# Altium footprint library MyComponents_v2.5.PcbLib: 403 footprints (part 15 of 26)
Each footprint in its own frame and in the unit in brackets; x right, y up, seen from the top. Pads: shape width x height; smd on the part's side, far side on the other; paste and mask are expansions set on the pad; w line width, h text height; cw(c..) or ccw(c..) is an arc to the next point about the centre after c.
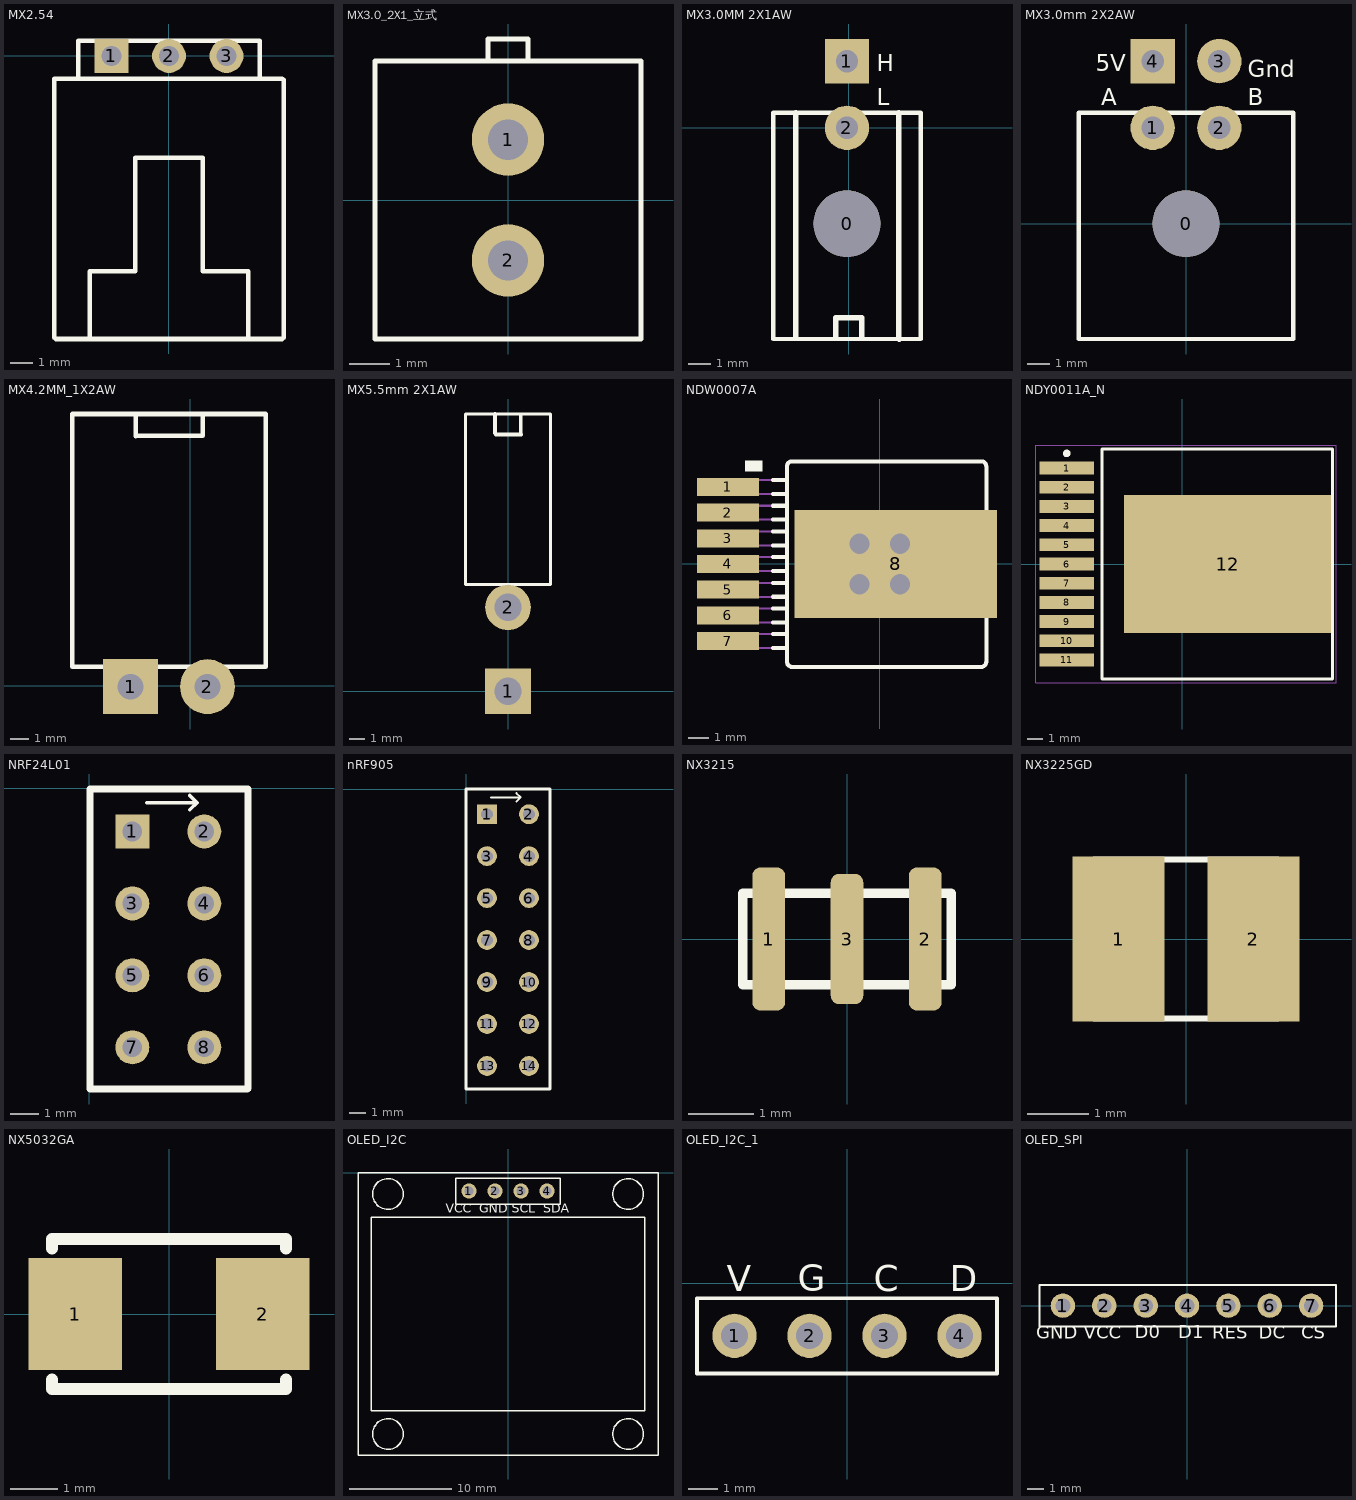
[diagram p14: the footprints below, top view; thin cyan lines are the x and y axes]

## MX2.54 [mm] "带锁插座"
pads (3):
  rect 1.5x1.5 hole 0.9: 1(-2.54,0)
  round 1.5 hole 0.9: 2(0,0) 3(2.54,0)
Top Overlay:
  lines w0.2: 5.06,-1.06 5.06,-6.44 5.06,-12.44 5,-12.5 -5,-12.5 -5.06,-12.44 -5.06,-1 ; -5.06,-1 -4,-1 -4,0.67 4,0.67 4,-1 5,-1 -5.06,-1 ; -3.5,-12.5 3.5,-12.5 3.5,-9.5 1.5,-9.5 1.5,-4.5 -1.5,-4.5 -1.5,-9.5 -3.5,-9.5 -3.5,-12.5

## MX3.0_2X1_立式 [mm]
pads (2):
  round 1.8 hole 1: 1(0,1.5) 2(0,-1.5)
Top Overlay:
  lines w0.127: -0.5,3.45 -0.5,4 0.5,4 0.5,3.45 ; -3.3,-3.45 3.3,-3.45 3.3,3.45 -3.3,3.45 -3.3,-3.45
3D body "MX3.0立式.STE": height 9.2, standoff -2.6, extent -3.302,-3.817 3.298,4.783

## MX3.0MM 2X1AW [mm]
pads (3):
  round 3 hole 3: 0(-0.074,-4.32)
  rect 2x2 hole 1: 1(-0.075,3)
  round 2 hole 1: 2(-0.075,0)
Top Overlay:
  lines w0.2: -3.4,-9.52 3.252,-9.52 3.252,0.68 -3.4,0.68 -3.4,-9.52
  lines w0.254: -2.386,-9.423 -2.386,0.68 ; -0.583,-9.423 -0.583,-8.56 0.585,-8.56 0.585,-9.474 ; 2.262,0.68 2.262,-9.495 2.287,-9.52
  text "L" at 1.27,1.016 h0.76
  text "H" at 1.27,2.54 h0.76
3D body "MX3.0mm 2x1.STEP": height 8.6, standoff -3.3, extent -3.376,-9.495 3.224,3.2

## MX3.0mm 2X2AW [mm] "molex 43025 3.0mm间距弯针(90°)"
pads (5):
  round 3 hole 3: 0(0,0)
  round 2 hole 1: 1(-1.5,4.32) 2(1.5,4.32) 3(1.5,7.32)
  rect 2x2 hole 1: 4(-1.5,7.32)
Top Overlay:
  lines w0.2: -4.825,-5.2 4.825,-5.2 4.825,5 -4.825,5 -4.825,-5.2
  text "B" at 2.794,5.334 h0.76
  text "A" at -3.81,5.334 h0.76
  text "Gnd" at 2.794,6.604 h0.76
  text "5V" at -4.064,6.858 h0.76
3D body "MX3.0 2X2.stp": height 12.23, standoff 1.47, extent -5.55,-7.3 4.6,8.1

## MX4.2MM_1X2AW [mm] "4.2mm间距"
pads (2):
  rect 3x3 hole 1.4: 1(-3.277,-0.051)
  round 3 hole 1.4: 2(0.94,-0.051)
Top Overlay:
  lines w0.254: -2.997,14.834 -2.997,13.665 -2.972,13.691 0.686,13.691 0.686,14.884 ; -6.477,1.041 4.14,1.041 4.14,14.884 -6.477,14.884 -6.477,2.769 -6.477,1.041

## MX5.5mm 2X1AW [mm] "molex 5569 5.5mm间距弯针(90°)"
pads (2):
  rect 3x3 hole 1.8: 1(0,0)
  round 3 hole 1.8: 2(0,5.5)
Top Overlay:
  lines w0.2: -2.8,7 -2.8,18.2 2.8,18.2 2.8,7 -2.8,7
  lines w0.254: -0.864,18.2 -0.864,16.942 -0.787,16.866 0.864,16.866 0.838,16.891 0.838,18.161
3D body "MX4.2.STEP": height 11.55, standoff -4.65, extent -2.743,-0.354 2.757,18.946

## NDW0007A [mm]
pads (8):
  rect 3.06x0.89 smd paste+0 mask+0.051: 1(-7.5,3.81) 2(-7.5,2.54) 3(-7.5,1.27) 4(-7.5,0) 5(-7.5,-1.27) 6(-7.5,-2.54) 7(-7.5,-3.81)
  rect 10x5.35 smd paste+0 mask+0.051: 8(0.8,0)
via 1,1 diameter 1.5 hole 1
via 1,-1 diameter 1.5 hole 1
via -1,-1 diameter 1.5 hole 1
via -1,1 diameter 1.5 hole 1
Top Overlay:
  region: -5.8,5.1 -6.65,5.1 -6.65,4.575 -5.8,4.575
  lines w0.2: -5.28,-4.16 -4.58,-4.16 -4.58,-3.47 -5.28,-3.47 ; -5.28,-2.89 -4.58,-2.89 -4.58,-2.2 -5.28,-2.2 ; -5.28,-1.62 -4.58,-1.62 -4.58,-0.93 -5.28,-0.93 ; -5.28,-0.35 -4.58,-0.35 -4.58,0.34 -5.28,0.34 ; -5.28,0.92 -4.58,0.92 -4.58,1.61 -5.28,1.61 ; -5.28,2.19 -4.58,2.19 -4.58,2.88 -5.28,2.88 ; -5.28,3.46 -4.58,3.46 -4.58,4.15 -5.28,4.15 ; -4.58,-4.837 ccw(c-4.33,-4.835) -4.332,-5.085 -4.33,-5.085 5.02,-5.085 5.022,-5.085 ccw(c5.02,-4.835) 5.27,-4.837 5.27,-4.835 5.27,4.825 5.27,4.827 ccw(c5.02,4.825) 5.022,5.075 5.02,5.075 -4.33,5.075 -4.332,5.075 ccw(c-4.33,4.825) -4.58,4.827 -4.58,4.825 -4.58,-4.835 -4.58,-4.837
Mechanical 13:
  lines w0.1: -4.332,-5.085 cw(c-4.33,-4.835) -4.58,-4.837 -4.58,-4.835 -4.58,4.825 -4.58,4.827 cw(c-4.33,4.825) -4.332,5.075 ; -4.33,-5.085 5.02,-5.085 ; -4.33,5.075 5.02,5.075 ; 5.022,-5.085 ccw(c5.02,-4.835) 5.27,-4.837 ; 5.022,5.075 cw(c5.02,4.825) 5.27,4.827 ; 5.27,-4.835 5.27,4.825 ; -8.5,-4.16 -8.5,-3.47 -5.28,-3.47 -4.58,-3.47 -4.58,-4.16 -5.28,-4.16 -8.5,-4.16 ; -8.5,-2.89 -8.5,-2.2 -5.28,-2.2 -4.58,-2.2 -4.58,-2.89 -5.28,-2.89 -8.5,-2.89 ; -8.5,-1.62 -8.5,-0.93 -5.28,-0.93 -4.58,-0.93 -4.58,-1.62 -5.28,-1.62 -8.5,-1.62 ; -8.5,-0.35 -8.5,0.34 -5.28,0.34 -4.58,0.34 -4.58,-0.35 -5.28,-0.35 -8.5,-0.35 ; -8.5,0.92 -8.5,1.61 -5.28,1.61 -4.58,1.61 -4.58,0.92 -5.28,0.92 -8.5,0.92 ; -8.5,2.19 -8.5,2.88 -5.28,2.88 -4.58,2.88 -4.58,2.19 -5.28,2.19 -8.5,2.19 ; -8.5,3.46 -8.5,4.15 -5.28,4.15 -4.58,4.15 -4.58,3.46 -5.28,3.46 -8.5,3.46
3D body "NDW0007A.stp": height 4.77, standoff 0, extent -8.601,-5.08 5.169,5.08

## NDY0011A_N [mm]
pads (12):
  rect 3.6x0.85 smd paste+0 mask+0.051: 1(-7.65,6.35) 2(-7.65,5.08) 3(-7.65,3.81) 4(-7.65,2.54) 5(-7.65,1.27) 6(-7.65,0) 7(-7.65,-1.27) 8(-7.65,-2.54) 9(-7.65,-3.81) 10(-7.65,-5.08) 11(-7.65,-6.35)
  rect 13.7x9.126 smd paste+0 mask+0.051: 12(3,0)
Top Overlay:
  circle w0.25: c-7.65,7.325 r0.125
  lines w0.2: -5.3,-7.625 -5.3,7.625 9.95,7.625 9.95,-7.625 -5.3,-7.625
Mechanical 13:
Mechanical 15:
  lines w0.05: -9.687,-7.875 10.188,-7.875 10.188,7.875 -9.687,7.875 -9.687,-7.875
  lines w0.1: -0.5,0 0.5,0 ; 0,-0.5 0,0.5
3D body "NDY0011A.stp": height 6.1, standoff -0.01, extent -8.756,-7.5 9.024,7.5

## NRF24L01 [mm] "2.4G"
pads (8):
  rect 1.2x1.2 hole 0.7: 1(1.524,-1.524)
  round 1.2 hole 0.7: 2(4.064,-1.524) 3(1.524,-4.064) 4(4.064,-4.064) 5(1.524,-6.604) 6(4.064,-6.604) 7(1.524,-9.144) 8(4.064,-9.144)
Top Overlay:
  lines w0.127: 2.032,-0.508 3.81,-0.508 ; 3.556,-0.254 3.81,-0.508 ; 3.81,-0.508 3.556,-0.762 3.81,-0.508
  lines w0.254: 0.024,-10.617 5.588,-10.617 5.613,-10.592 5.613,-0.024 0.024,-0.024 0.024,-10.617
Bottom Overlay:
  text "3V3" at 5.08,-0.762 h0.76
  text "GND" at 2.54,-0.762 h0.76

## nRF905 [mm] "433/868/915MHz"
pads (14):
  rect 1.2x1.2 hole 0.7: 1(1.27,-1.524)
  round 1.2 hole 0.7: 2(3.81,-1.524) 3(1.27,-4.064) 4(3.81,-4.064) 5(1.27,-6.604) 6(3.81,-6.604) 7(1.27,-9.144) 8(3.81,-9.144) 9(1.27,-11.684) 10(3.81,-11.684) 11(1.27,-14.224) 12(3.81,-14.224) 13(1.27,-16.764) 14(3.81,-16.764)
Top Overlay:
  lines w0.127: 1.524,-0.508 3.302,-0.508 ; 3.048,-0.762 3.302,-0.508 ; 3.048,-0.254 3.302,-0.508
  lines w0.2: 0,-18.161 0,0 5.08,0 5.08,-18.161 0,-18.161
Bottom Overlay:
  text "GND" at 3.556,-18.034 h0.76
  text "3V3" at 2.286,-0.762 h0.76

## NX3215 [mm]
pads (3):
  rrect50% 0.5x2.2 smd: 1(-1.2,0) 2(1.2,0)
  rrect50% 0.5x2 smd: 3(0,0)
Top Overlay:
  lines w0.15: -1.6,-0.7 1.6,-0.7 1.6,0.7 -1.6,0.7 -1.6,-0.7
3D body "NX3215SA.step": height 0.8, standoff 0, extent -1.6,-0.75 1.6,0.75

## NX3225GD [mm]
pads (2):
  rect 1.5x2.7 smd: 1(-1.1,0) 2(1.1,0)
Top Overlay:
  lines w0.1: -1.5,-1.3 1.5,-1.3 ; -1.5,1.3 1.5,1.3
3D body "SX3225.step": height 0.81, standoff 0, extent -1.625,-1.25 1.575,1.25

## NX5032GA [mm] "贴片晶振，5mm x 3.2mm"
pads (2):
  rect 2x2.4 smd: 1(-2,0) 2(2,0)
Top Overlay:
  lines w0.254: -2.5,-1.4 -2.5,-1.6 -2,-1.6 2,-1.6 2.5,-1.6 2.5,-1.4 ; -2.5,1.4 -2.5,1.6 -2,1.6 2,1.6 2.5,1.6 2.5,1.4
3D body "User Library-ABM3-1.STEP": height 1.3, standoff 0, extent -2.5,-1.6 2.5,1.6

## OLED_I2C [mm]
pads (4):
  round 1.5 hole 0.9: 1(-3.81,-1.778) 2(-1.27,-1.778) 3(1.27,-1.778) 4(3.81,-1.778)
Top Overlay:
  circle w0.127: c11.725,-25.51 r1.5
  circle w0.127: c-11.725,-25.51 r1.5
  circle w0.127: c11.725,-2.06 r1.5
  circle w0.127: c-11.725,-2.06 r1.5
  lines w0.127: -5.08,-3.052 5.08,-3.052 ; -5.08,-3.048 -5.08,-0.508 5.08,-0.508 5.08,-3.048 ; -14.65,-27.57 14.65,-27.57 14.65,0 -14.65,0 -14.65,-27.57 ; -13.335,-23.241 13.335,-23.241 13.335,-4.318 -13.335,-4.318 -13.335,-23.241
  text "SDA" at 3.429,-4.191 h1.52
  text "SCL" at 0.381,-4.191 h1.52
  text "GND" at -2.794,-4.191 h1.52
  text "VCC" at -6.096,-4.191 h1.52
3D body "Femal Header 1x4.step": height 8.5, standoff -3.2, extent -5.08,-3.15 5.08,-0.61
3D body "OLED 0.96inch.step": height 13.47, standoff 2.63, extent -13.39,-27.428 13.31,0.432

## OLED_I2C_1 [mm] "无外框"
pads (4):
  round 1.5 hole 0.9: 1(-3.81,-1.778) 2(-1.27,-1.778) 3(1.27,-1.778) 4(3.81,-1.778)
Top Overlay:
  lines w0.127: -5.08,-3.052 5.08,-3.052 ; -5.08,-3.048 -5.08,-0.508 5.08,-0.508 5.08,-3.048
  text "V" at -4.075,-0.575 h1.52
  text "G" at -1.675,-0.55 h1.52
  text "C" at 0.9,-0.575 h1.52
  text "D" at 3.475,-0.575 h1.52
3D body "Femal Header 1x4.step": height 8.5, standoff -3.2, extent -5.08,-3.15 5.08,-0.61
3D body "OLED 0.96inch.step": height 13.47, standoff 2.63, extent -13.39,-27.428 13.31,0.432

## OLED_SPI [mm]
pads (7):
  round 1.5 hole 0.9: 1(-7.62,0) 2(-5.08,0) 3(-2.54,0) 4(0,0) 5(2.54,0) 6(5.08,0) 7(7.62,0)
Top Overlay:
  lines w0.127: -9.05,-1.274 -9.05,1.27 9.15,1.27 9.15,-1.274 -9.05,-1.274
  text "VCC" at -6.35,-2.3 h1.4
  text "GND" at -9.275,-2.3 h1.4
  text "D0" at -3.2,-2.288 h1.4
  text "D1" at -0.55,-2.288 h1.4
  text "RES" at 1.55,-2.3 h1.4
  text "DC" at 4.4,-2.3 h1.4
  text "CS" at 7.025,-2.3 h1.4
3D body "Femal Header 1x4.step": height 8.5, standoff -3.2, extent -5.08,-1.372 5.08,1.168
3D body "OLED 0.96inch.step": height 13.47, standoff 2.63, extent -13.39,-25.65 13.31,2.21